# Altium footprint library CPU_STM_080816.PcbLib: 220 footprints (part 12 of 16)
Each footprint in its own frame and in the unit in brackets; x right, y up, seen from the top. Pads: shape width x height; smd on the part's side, far side on the other; paste and mask are expansions set on the pad; w line width, h text height; cw(c..) or ccw(c..) is an arc to the next point about the centre after c.
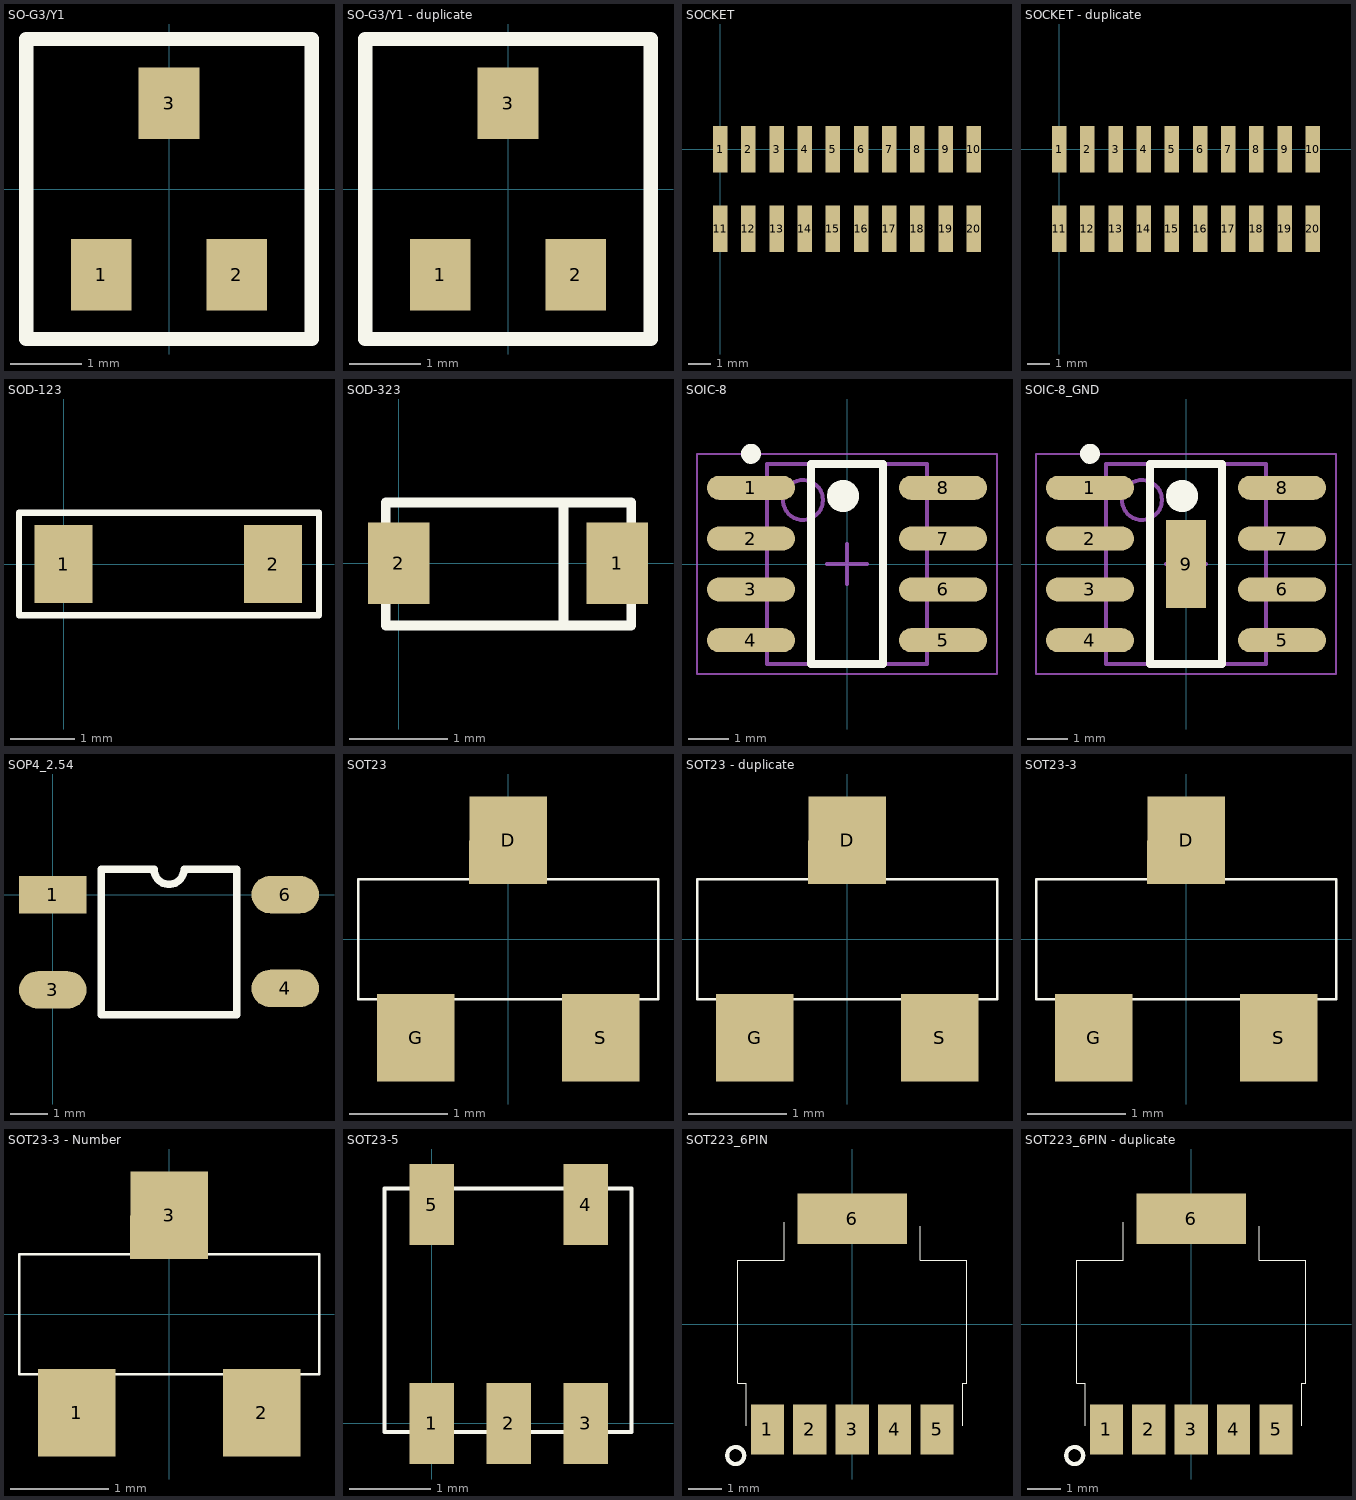
[diagram p11: the footprints below, top view; thin cyan lines are the x and y axes]

## SO-G3/Y1 [mm]
pads (3):
  rect 0.85x1 smd: 1(-0.95,-1.2) 2(0.95,-1.2) 3(0,1.2)
Top Overlay:
  lines w0.2: -2,-2.1 2,-2.1 2,2.1 -2,2.1 -2,-2.1

## SO-G3/Y1 - duplicate [mm]
pads (3):
  rect 0.85x1 smd: 1(-0.95,-1.2) 2(0.95,-1.2) 3(0,1.2)
Top Overlay:
  lines w0.2: -2,-2.1 2,-2.1 2,2.1 -2,2.1 -2,-2.1

## SOCKET [mm]
pads (20):
  rect 0.65x2.1 smd: 1(0,0) 2(1.27,0) 3(2.54,0) 4(3.81,0) 5(5.08,0) 6(6.35,0) 7(7.62,0) 8(8.89,0) 9(10.16,0) 10(11.43,0) 11(0,-3.6) 12(1.27,-3.6) 13(2.54,-3.6) 14(3.81,-3.6) 15(5.08,-3.6) 16(6.35,-3.6) 17(7.62,-3.6) 18(8.89,-3.6) 19(10.16,-3.6) 20(11.43,-3.6)

## SOCKET - duplicate [mm]
pads (20):
  rect 0.65x2.1 smd: 1(0,0) 2(1.27,0) 3(2.54,0) 4(3.81,0) 5(5.08,0) 6(6.35,0) 7(7.62,0) 8(8.89,0) 9(10.16,0) 10(11.43,0) 11(0,-3.6) 12(1.27,-3.6) 13(2.54,-3.6) 14(3.81,-3.6) 15(5.08,-3.6) 16(6.35,-3.6) 17(7.62,-3.6) 18(8.89,-3.6) 19(10.16,-3.6) 20(11.43,-3.6)

## SOD-123 [mm]
pads (2):
  rect 0.91x1.22 smd: 1(0,0) 2(3.28,0)
Top Overlay:
  lines w0.1: -0.7,-0.8 4,-0.8 4,0.8 -0.7,0.8 -0.7,-0.8
3D body "CircuitWorks-SOD123.step": height 1.28, standoff 0.01, extent -0.25,-0.8 3.45,0.8

## SOD-323 [mm]
pads (2):
  rect 0.63x0.83 smd: 1(2.225,0) 2(0,0)
Top Overlay:
  lines w0.1: 1.676,-0.635 1.676,0.615 ; -0.132,-0.635 -0.132,0.615 2.368,0.615 2.368,-0.635 -0.132,-0.635
3D body "User Library-SOD323.step": height 0.9, standoff -0.09, extent -0.132,-0.64 2.368,0.61

## SOIC-8 [mm]
pads (8):
  oval 2.2x0.6 smd: 1(-2.4,1.905) 2(-2.4,0.635) 3(-2.4,-0.635) 4(-2.4,-1.905) 5(2.4,-1.905) 6(2.4,-0.635) 7(2.4,0.635) 8(2.4,1.905)
Top Overlay:
  circle w0.25: c-2.4,2.755 r0.125
  circle w0.4: c-0.1,1.7 r0.2
  lines w0.2: -0.9,-2.5 -0.9,2.5 0.9,2.5 0.9,-2.5 -0.9,-2.5
Mechanical 13:
  circle w0.1: c-1.1,1.6 r0.5
  lines w0.1: -2,-2.5 -2,2.5 2,2.5 2,-2.5 -2,-2.5
Mechanical 15:
  lines w0.05: -3.75,-2.75 -3.75,2.75 3.75,2.75 3.75,-2.75 -3.75,-2.75
  lines w0.1: -0.5,0 0.5,0 ; 0,-0.5 0,0.5
3D body "SOIC-8-1.step": height 1.75, standoff 0, extent -3,-2.45 3,2.45

## SOIC-8_GND [mm]
pads (9):
  oval 2.2x0.6 smd: 1(-2.4,1.905) 2(-2.4,0.635) 3(-2.4,-0.635) 4(-2.4,-1.905) 5(2.4,-1.905) 6(2.4,-0.635) 7(2.4,0.635) 8(2.4,1.905)
  rect 1x2.2 smd: 9(0,0)
Top Overlay:
  circle w0.25: c-2.4,2.755 r0.125
  circle w0.4: c-0.1,1.7 r0.2
  lines w0.2: -0.9,-2.5 -0.9,2.5 0.9,2.5 0.9,-2.5 -0.9,-2.5
Mechanical 13:
  circle w0.1: c-1.1,1.6 r0.5
  lines w0.1: -2,-2.5 -2,2.5 2,2.5 2,-2.5 -2,-2.5
Mechanical 15:
  lines w0.05: -3.75,-2.75 -3.75,2.75 3.75,2.75 3.75,-2.75 -3.75,-2.75
  lines w0.1: -0.5,0 0.5,0 ; 0,-0.5 0,0.5
3D body "SOIC-8-1.step": height 1.75, standoff 0, extent -3,-2.45 3,2.45

## SOP4_2.54 [mm]
height 7.2
pads (4):
  rect 1.8x1 smd: 1(0,0)
  oval 1.8x1 smd: 3(0,-2.54) 4(6.2,-2.5) 6(6.2,0)
Top Overlay:
  lines w0.2: 1.3,-3.2 4.9,-3.2 4.9,0.675 3.5,0.675 cw(c3.1,0.675) 2.7,0.675 1.3,0.675 1.3,-3.2

## SOT23 [mil] "SOT23-3"
pads (3):
  rect 31x35 smd: D(0,39.5) G(-37,-39.5) S(37,-39.5)
Top Overlay:
  lines w1: -60,-24 -60,24 60,24 60,-24 -60,-24

## SOT23 - duplicate [mil] "SOT23-3"
pads (3):
  rect 31x35 smd: D(0,39.5) G(-37,-39.5) S(37,-39.5)
Top Overlay:
  lines w1: -60,-24 -60,24 60,24 60,-24 -60,-24

## SOT23-3 [mil] "SOT23-3"
pads (3):
  rect 31x35 smd: D(0,39.5) G(-37,-39.5) S(37,-39.5)
Top Overlay:
  lines w1: -60,-24 60,-24 60,24 -60,24 -60,-24

## SOT23-3 - Number [mil] "SOT23-3"
pads (3):
  rect 31x35 smd: 1(-37,-39.5) 2(37,-39.5) 3(0,39.5)
Top Overlay:
  lines w1: -60,-24 -60,24 60,24 60,-24 -60,-24
3D body "User Library-SOT95P280X135-3M[SOT23_TO-236AA].step": height 51.18, standoff 0, extent -59.06,-59.06 59.05,59.05

## SOT23-5 [mm] "R-PDSO-N5"
pads (5):
  rect 0.55x1 smd mask+0.05: 1(0,0) 2(0.95,0) 3(1.9,0) 4(1.9,2.7) 5(0,2.7)
Top Overlay:
  lines w0.05: -0.585,-0.103 2.465,-0.103 2.465,2.897 -0.585,2.897 -0.585,-0.103
3D body "User Library-R-PDSO-G5.step": height 1.3, standoff -0.15, extent -0.585,-0.103 2.465,2.897

## SOT223_6PIN [mil] "SOT223_6PIN"
pads (6):
  rect 39x59 smd: 1(-100,-124) 2(-50,-124) 3(0,-124) 4(50,-124) 5(100,-124)
  rect 129x59 smd: 6(0,124)
Top Overlay:
  circle w5: c-137.28,-154.83 r10
  lines w1: -125,-120 -125,-70 -135,-70 -135,75 -80,75 -80,120 ; 80,115 80,75 135,75 135,-70 130,-70 130,-120

## SOT223_6PIN - duplicate [mil] "SOT223_6PIN"
pads (6):
  rect 39x59 smd: 1(-100,-124) 2(-50,-124) 3(0,-124) 4(50,-124) 5(100,-124)
  rect 129x59 smd: 6(0,124)
Top Overlay:
  circle w5: c-137.28,-154.83 r10
  lines w1: -125,-120 -125,-70 -135,-70 -135,75 -80,75 -80,120 ; 80,115 80,75 135,75 135,-70 130,-70 130,-120